# Altium schematic symbol library IC_ADI.SCHLIB: 3169 symbols (part 2 of 181)
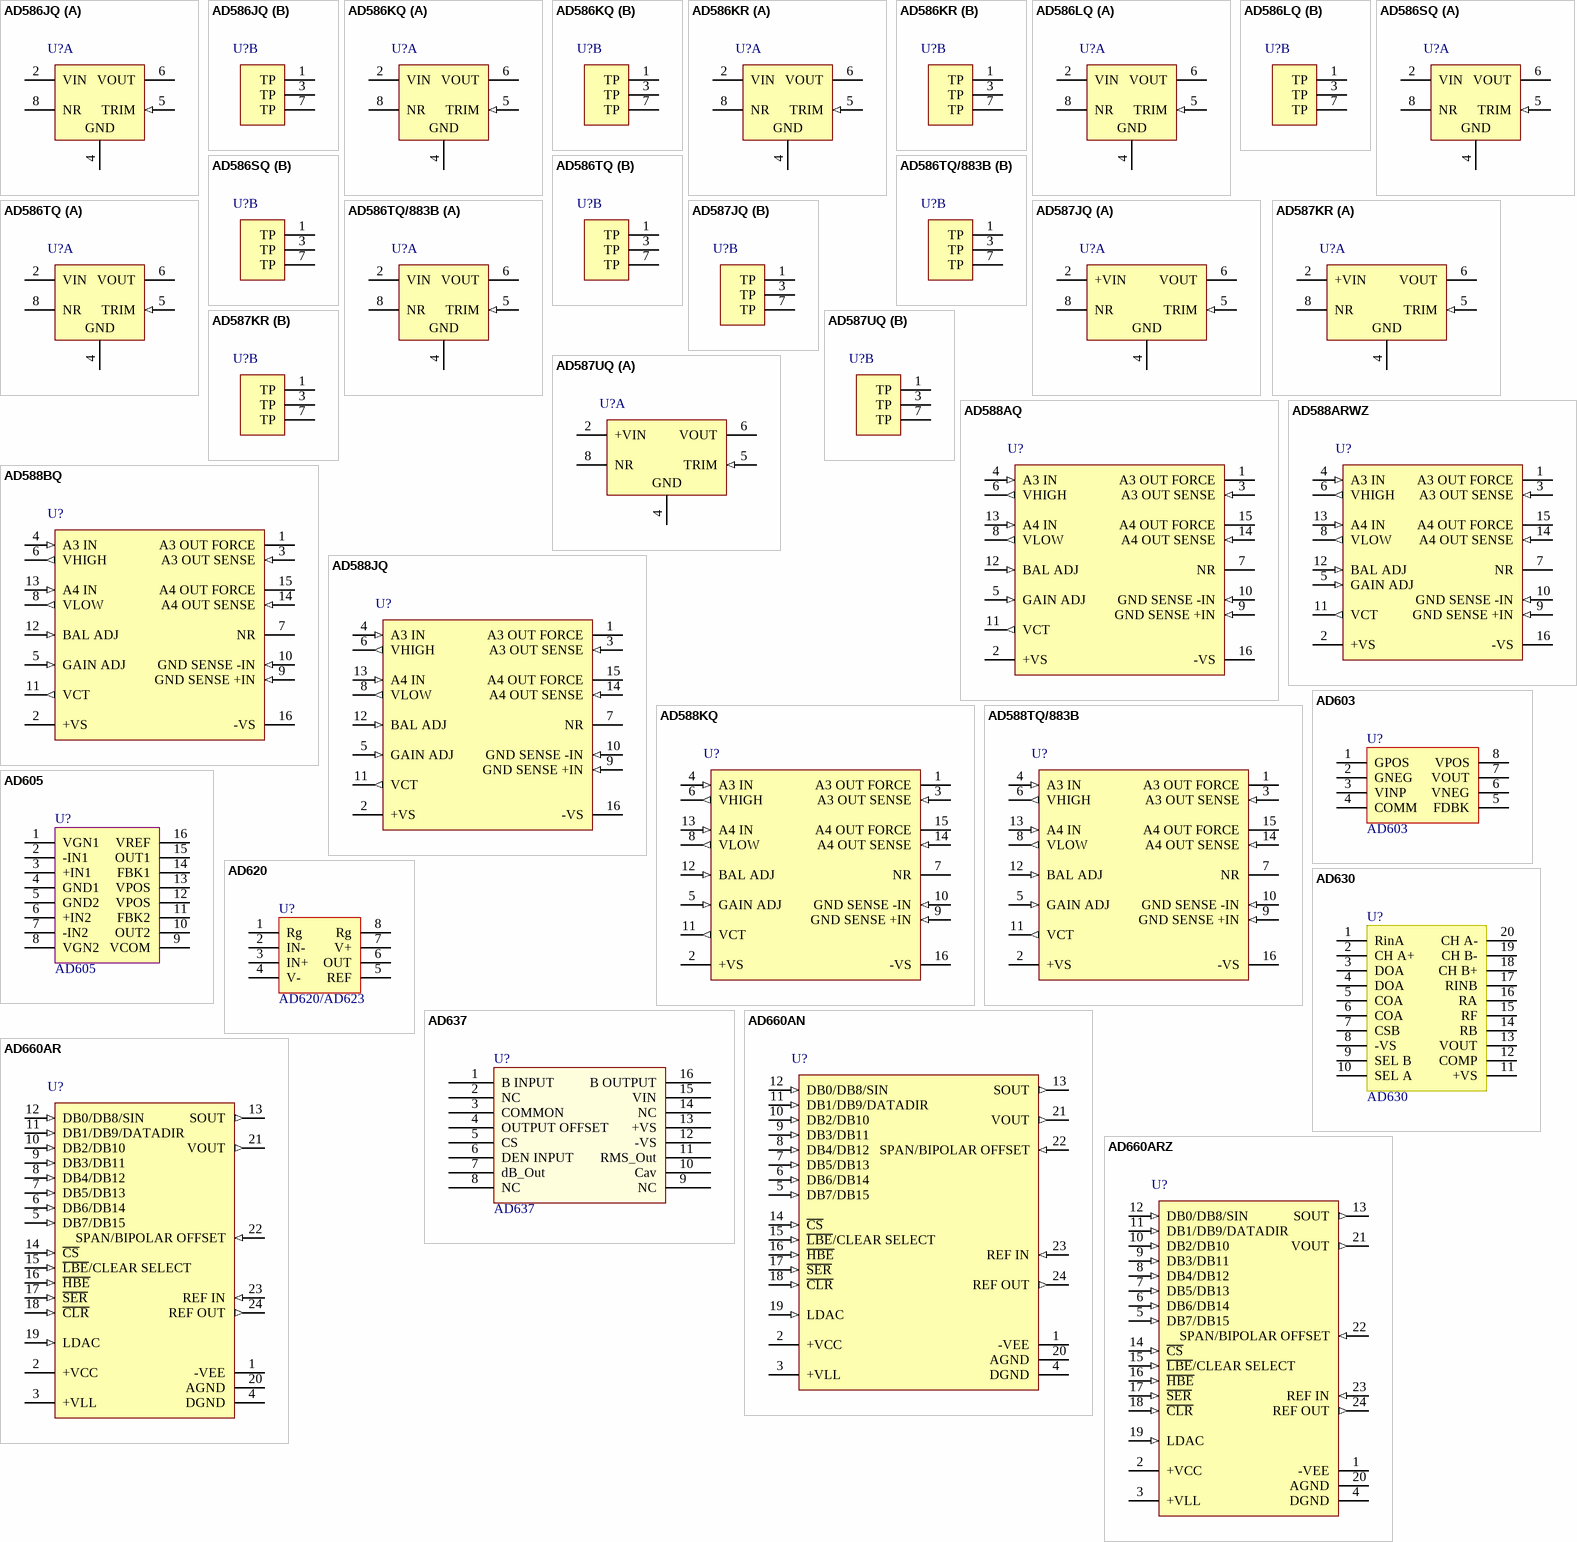
[diagram p192: symbols AD586JQ to AD660ARZ]

## AD587JQ
designator U?
High Precision Voltage Reference, 10 V Output, 13.5 to 36 V Supply, Commercial, 8-pin DIP (Q-8), Tube; PartNumber: AD587JQ; Ref Out TC (ppm/C): 20; Vout: 10V; DatasheetVersion: Rev. H; PackageVersion: Aug-05; PackageReference: Q-8; PackageDescription: 8-Pin Ceramic Dual In-Line Package, Row spacing 7.62 mm, Pitch 2.54 mm; Supplier Part Number 1: AD587JQ-ND; Supplier Part Number 2: 584-AD587JQ; Packing: Tube; Operating Temp Range: 0 to 70 degC; Mounting Technology: Through Hole; ComponentLink1Description: Manufacturer URL; ComponentLink2Description: Datasheet; ComponentLink3Description: Package Specification; ComponentLink4Description: URL Link1
footprint DIP8 (Footprint not found)
part A pins: 2 +VIN (power) "Input Voltage.", 4 GND (power) "Ground.", 5 TRIM (in) "Fine Trimming of Output Voltage.", 6 VOUT (power) "Output Voltage.", 8 NR "Noise Reduction of Output Voltage. Reduces noise via external capacitor to ground."
part B pins: 1 TP "No Connection. Leave floating.", 3 TP "No Connection. Leave floating.", 7 TP "No Connection. Leave floating."

## AD587KR
designator U?
High Precision Voltage Reference, 10 V Output, 13.5 to 36 V Supply, Commercial, 8-pin SOIC (R-8), Tube; PartNumber: AD587KR; Ref Out TC (ppm/C): 10; Vout: 10V; DatasheetVersion: Rev. H; PackageVersion: 060506-A, 06/2006; PackageReference: R-8; PackageDescription: 8-Pin Standard Small Outline Package, Body 4.9 x 3.9 mm, Pitch 1.27 mm; Supplier Part Number 1: AD587KR-ND; Supplier Part Number 2: N/A; Packing: Tube; Operating Temp Range: 0 to 70 degC; Mounting Technology: Surface Mount; Code_JEDEC: MS-012-AA; ComponentLink1Description: Manufacturer URL; ComponentLink2Description: Datasheet; ComponentLink3Description: Package Specification; ComponentLink4Description: URL Link1
footprint SOIC8_1.27 (Footprint not found)
part A pins: 2 +VIN (power) "Input Voltage.", 4 GND (power) "Ground.", 5 TRIM (in) "Fine Trimming of Output Voltage.", 6 VOUT (power) "Output Voltage.", 8 NR "Noise Reduction of Output Voltage. Reduces noise via external capacitor to ground."
part B pins: 1 TP "No Connection. Leave floating.", 3 TP "No Connection. Leave floating.", 7 TP "No Connection. Leave floating."

## AD587UQ
designator U?
High Precision Voltage Reference, 10 V Output, 13.5 to 36 V Supply, Military, 8-pin DIP (Q-8), Tube; PartNumber: AD587UQ; Ref Out TC (ppm/C): 5; Vout: 10V; DatasheetVersion: Rev. H; PackageVersion: Aug-05; PackageReference: Q-8; PackageDescription: 8-Pin Ceramic Dual In-Line Package, Row spacing 7.62 mm, Pitch 2.54 mm; Supplier Part Number 1: AD587UQ-ND; Supplier Part Number 2: 584-AD587UQ; Packing: Tube; Operating Temp Range: -55 to 125 degC; Mounting Technology: Through Hole; ComponentLink1Description: Manufacturer URL; ComponentLink2Description: Datasheet; ComponentLink3Description: Package Specification; ComponentLink4Description: URL Link1
footprint DIP8 (Footprint not found)
part A pins: 2 +VIN (power) "Input Voltage.", 4 GND (power) "Ground.", 5 TRIM (in) "Fine Trimming of Output Voltage.", 6 VOUT (power) "Output Voltage.", 8 NR "Noise Reduction of Output Voltage. Reduces noise via external capacitor to ground."
part B pins: 1 TP "No Connection. Leave floating.", 3 TP "No Connection. Leave floating.", 7 TP "No Connection. Leave floating."

## AD588AQ
designator U?
Multiple Output, High Precision, Dual-Tracking Reference, + / - 10, + / - 5 V Output, + / - 15 V Supply, Industrial, 16-pin DIP (Q-16), Tube; PartNumber: AD588AQ; Ref Out TC (ppm/C): 3; Vout: +/-5V, +/-10V; DatasheetVersion: Rev. L; PackageVersion: Aug-05; PackageReference: Q-16; PackageDescription: 16-Pin Ceramic Dual In-Line Package, Row spacing 7.62 mm, Pitch 2.54 mm; Supplier Part Number 1: AD588AQ-ND; Supplier Part Number 2: 584-AD588AQ; Packing: Tube; Operating Temp Range: -25 to 85 degC; Mounting Technology: Through Hole; ComponentLink1Description: Manufacturer URL; ComponentLink2Description: Datasheet; ComponentLink3Description: Package Specification; ComponentLink4Description: URL Link1
footprint DIP16 (Footprint not found)
pins: 1 A3 OUT FORCE (power) "Output from Buffering Amplifier 3 with Kelvin Force. Connect to Pin 3.", 2 +VS (power) "Positive Power Supply.", 3 A3 OUT SENSE (in) "Output from Buffering Amplifier 3 with Kelvin Sense. Connect to Pin 1.", 4 A3 IN (in) "+ Input to Amplifier 3. Connect to VHIGH, Pin 6.", 5 GAIN ADJ (in) "Reference Gain Adjustment for Calibration. See the Calibration section.", 6 VHIGH (out) "Unbuffered Reference High Output.", 7 NR "Noise Filtering Pin. Connect external 1 uF capacitor to ground to reduce the output noise (see the Noise Performance and Reduction section). Can be left open.", 8 VLOW (out) "Unbuffered Reference Low Output.", 9 GND SENSE +IN (in) "+ Input to the Ground Sense Amplifier.", 10 GND SENSE -IN (in) "- Input to the Ground Sense Amplifier.", 11 VCT (out) "Center Tap Voltage used for Calibration. See the Calibration section.", 12 BAL ADJ (in) "Reference Centering Adjustment for Calibration. See the Calibration section.", 13 A4 IN (in) "+ Input to Amplifier 4. Connect to VLOW, Pin 8.", 14 A4 OUT SENSE (in) "Output of Buffering Amplifier 4 with Kelvin Sense. Connect to Pin 15.", 15 A4 OUT FORCE (power) "Output of Buffering Amplifier 4 with Kelvin Force. Connect to Pin 14.", 16 -VS (power) "Negative Power Supply."

## AD588ARWZ
designator U?
Multiple Output, High Precision, Dual-Tracking Reference, + / - 10, + / - 5 V Output, + / - 15 V Supply, Industrial, 16-pin SOIC (RW-16), Tube; PartNumber: AD588ARWZ; Ref Out TC (ppm/C): 3; Vout: +/-5V, +/-10V; DatasheetVersion: Rev. L; PackageVersion: 032707-B, 03/2007; PackageReference: RW-16; PackageDescription: 16-Pin Standard Small Outline Package, Body 10.3 x 7.5 mm, Pitch 1.27 mm; Supplier Part Number 1: AD588ARWZ-ND; Supplier Part Number 2: 2377055; Supplier Part Number 3: 584-AD588ARWZ; Packing: Tube; Operating Temp Range: -25 to 85 degC; Mounting Technology: Surface Mount; Code_JEDEC: MS-013-AA; ComponentLink1Description: Manufacturer URL; ComponentLink2Description: Datasheet; ComponentLink3Description: Package Specification; ComponentLink4Description: URL Link1
footprint SOIC16W_1.27 (Footprint not found)
pins: 1 A3 OUT FORCE (power) "Output from Buffering Amplifier 3 with Kelvin Force. Connect to Pin 3.", 2 +VS (power) "Positive Power Supply.", 3 A3 OUT SENSE (in) "Output from Buffering Amplifier 3 with Kelvin Sense. Connect to Pin 1.", 4 A3 IN (in) "+ Input to Amplifier 3. Connect to VHIGH, Pin 6.", 5 GAIN ADJ (in) "Reference Gain Adjustment for Calibration. See the Calibration section.", 6 VHIGH (out) "Unbuffered Reference High Output.", 7 NR "Noise Filtering Pin. Connect external 1 uF capacitor to ground to reduce the output noise (see the Noise Performance and Reduction section). Can be left open.", 8 VLOW (out) "Unbuffered Reference Low Output.", 9 GND SENSE +IN (in) "+ Input to the Ground Sense Amplifier.", 10 GND SENSE -IN (in) "- Input to the Ground Sense Amplifier.", 11 VCT (out) "Center Tap Voltage used for Calibration. See the Calibration section.", 12 BAL ADJ (in) "Reference Centering Adjustment for Calibration. See the Calibration section.", 13 A4 IN (in) "+ Input to Amplifier 4. Connect to VLOW, Pin 8.", 14 A4 OUT SENSE (in) "Output of Buffering Amplifier 4 with Kelvin Sense. Connect to Pin 15.", 15 A4 OUT FORCE (power) "Output of Buffering Amplifier 4 with Kelvin Force. Connect to Pin 14.", 16 -VS (power) "Negative Power Supply."

## AD588BQ
designator U?
Multiple Output, High Precision, Dual-Tracking Reference, + / - 10, + / - 5 V Output, + / - 15 V Supply, Industrial, 16-pin DIP (Q-16), Tube; PartNumber: AD588BQ; Ref Out TC (ppm/C): 1.5; Vout: +/-5V, +/-10V; DatasheetVersion: Rev. L; PackageVersion: Aug-05; PackageReference: Q-16; PackageDescription: 16-Pin Ceramic Dual In-Line Package, Row spacing 7.62 mm, Pitch 2.54 mm; Supplier Part Number 1: AD588BQ-ND; Supplier Part Number 2: 584-AD588BQ; Packing: Tube; Operating Temp Range: -25 to 85 degC; Mounting Technology: Through Hole; ComponentLink1Description: Manufacturer URL; ComponentLink2Description: Datasheet; ComponentLink3Description: Package Specification; ComponentLink4Description: URL Link1
footprint DIP16 (Footprint not found)
pins: 1 A3 OUT FORCE (power) "Output from Buffering Amplifier 3 with Kelvin Force. Connect to Pin 3.", 2 +VS (power) "Positive Power Supply.", 3 A3 OUT SENSE (in) "Output from Buffering Amplifier 3 with Kelvin Sense. Connect to Pin 1.", 4 A3 IN (in) "+ Input to Amplifier 3. Connect to VHIGH, Pin 6.", 5 GAIN ADJ (in) "Reference Gain Adjustment for Calibration. See the Calibration section.", 6 VHIGH (out) "Unbuffered Reference High Output.", 7 NR "Noise Filtering Pin. Connect external 1 uF capacitor to ground to reduce the output noise (see the Noise Performance and Reduction section). Can be left open.", 8 VLOW (out) "Unbuffered Reference Low Output.", 9 GND SENSE +IN (in) "+ Input to the Ground Sense Amplifier.", 10 GND SENSE -IN (in) "- Input to the Ground Sense Amplifier.", 11 VCT (out) "Center Tap Voltage used for Calibration. See the Calibration section.", 12 BAL ADJ (in) "Reference Centering Adjustment for Calibration. See the Calibration section.", 13 A4 IN (in) "+ Input to Amplifier 4. Connect to VLOW, Pin 8.", 14 A4 OUT SENSE (in) "Output of Buffering Amplifier 4 with Kelvin Sense. Connect to Pin 15.", 15 A4 OUT FORCE (power) "Output of Buffering Amplifier 4 with Kelvin Force. Connect to Pin 14.", 16 -VS (power) "Negative Power Supply."

## AD588JQ
designator U?
Multiple Output, High Precision, Dual-Tracking Reference, + / - 10, + / - 5 V Output, + / - 15 V Supply, Commercial, 16-pin DIP (Q-16), Tube; PartNumber: AD588JQ; Ref Out TC (ppm/C): 3; Vout: +/-5V, +/-10V; DatasheetVersion: Rev. L; PackageVersion: Aug-05; PackageReference: Q-16; PackageDescription: 16-Pin Ceramic Dual In-Line Package, Row spacing 7.62 mm, Pitch 2.54 mm; Supplier Part Number 1: AD588JQ-ND; Supplier Part Number 2: 411700; Supplier Part Number 3: 584-AD588JQ; Packing: Tube; Operating Temp Range: 0 to 70 degC; Mounting Technology: Through Hole; ComponentLink1Description: Manufacturer URL; ComponentLink2Description: Datasheet; ComponentLink3Description: Package Specification; ComponentLink4Description: URL Link1
footprint DIP16 (Footprint not found)
pins: 1 A3 OUT FORCE (power) "Output from Buffering Amplifier 3 with Kelvin Force. Connect to Pin 3.", 2 +VS (power) "Positive Power Supply.", 3 A3 OUT SENSE (in) "Output from Buffering Amplifier 3 with Kelvin Sense. Connect to Pin 1.", 4 A3 IN (in) "+ Input to Amplifier 3. Connect to VHIGH, Pin 6.", 5 GAIN ADJ (in) "Reference Gain Adjustment for Calibration. See the Calibration section.", 6 VHIGH (out) "Unbuffered Reference High Output.", 7 NR "Noise Filtering Pin. Connect external 1 uF capacitor to ground to reduce the output noise (see the Noise Performance and Reduction section). Can be left open.", 8 VLOW (out) "Unbuffered Reference Low Output.", 9 GND SENSE +IN (in) "+ Input to the Ground Sense Amplifier.", 10 GND SENSE -IN (in) "- Input to the Ground Sense Amplifier.", 11 VCT (out) "Center Tap Voltage used for Calibration. See the Calibration section.", 12 BAL ADJ (in) "Reference Centering Adjustment for Calibration. See the Calibration section.", 13 A4 IN (in) "+ Input to Amplifier 4. Connect to VLOW, Pin 8.", 14 A4 OUT SENSE (in) "Output of Buffering Amplifier 4 with Kelvin Sense. Connect to Pin 15.", 15 A4 OUT FORCE (power) "Output of Buffering Amplifier 4 with Kelvin Force. Connect to Pin 14.", 16 -VS (power) "Negative Power Supply."

## AD588KQ
designator U?
Multiple Output, High Precision, Dual-Tracking Reference, + / - 10, + / - 5 V Output, + / - 15 V Supply, Commercial, 16-pin DIP (Q-16), Tube; PartNumber: AD588KQ; Ref Out TC (ppm/C): 1.5; Vout: +/-5V, +/-10V; DatasheetVersion: Rev. L; PackageVersion: Aug-05; PackageReference: Q-16; PackageDescription: 16-Pin Ceramic Dual In-Line Package, Row spacing 7.62 mm, Pitch 2.54 mm; Supplier Part Number 1: AD588KQ-ND; Supplier Part Number 2: 584-AD588KQ; Packing: Tube; Operating Temp Range: 0 to 70 degC; Mounting Technology: Through Hole; ComponentLink1Description: Manufacturer URL; ComponentLink2Description: Datasheet; ComponentLink3Description: Package Specification; ComponentLink4Description: URL Link1
footprint DIP16 (Footprint not found)
pins: 1 A3 OUT FORCE (power) "Output from Buffering Amplifier 3 with Kelvin Force. Connect to Pin 3.", 2 +VS (power) "Positive Power Supply.", 3 A3 OUT SENSE (in) "Output from Buffering Amplifier 3 with Kelvin Sense. Connect to Pin 1.", 4 A3 IN (in) "+ Input to Amplifier 3. Connect to VHIGH, Pin 6.", 5 GAIN ADJ (in) "Reference Gain Adjustment for Calibration. See the Calibration section.", 6 VHIGH (out) "Unbuffered Reference High Output.", 7 NR "Noise Filtering Pin. Connect external 1 uF capacitor to ground to reduce the output noise (see the Noise Performance and Reduction section). Can be left open.", 8 VLOW (out) "Unbuffered Reference Low Output.", 9 GND SENSE +IN (in) "+ Input to the Ground Sense Amplifier.", 10 GND SENSE -IN (in) "- Input to the Ground Sense Amplifier.", 11 VCT (out) "Center Tap Voltage used for Calibration. See the Calibration section.", 12 BAL ADJ (in) "Reference Centering Adjustment for Calibration. See the Calibration section.", 13 A4 IN (in) "+ Input to Amplifier 4. Connect to VLOW, Pin 8.", 14 A4 OUT SENSE (in) "Output of Buffering Amplifier 4 with Kelvin Sense. Connect to Pin 15.", 15 A4 OUT FORCE (power) "Output of Buffering Amplifier 4 with Kelvin Force. Connect to Pin 14.", 16 -VS (power) "Negative Power Supply."

## AD588TQ/883B
designator U?
Multiple Output, High Precision, Dual-Tracking Reference, + / - 10, + / - 5 V Output, + / - 15 V Supply, Military, 16-pin DIP (Q-16), Tube; PartNumber: AD588TQ/883B; Vout: +/-5V, +/-10V; DatasheetVersion: Rev. L; PackageVersion: Aug-05; PackageReference: Q-16; PackageDescription: 16-Pin Ceramic Dual In-Line Package, Row spacing 7.62 mm, Pitch 2.54 mm; Supplier Part Number 1: 584-AD588TQ883B; Packing: Tube; Mounting Technology: Through Hole; ComponentLink1Description: Manufacturer URL; ComponentLink2Description: Datasheet; ComponentLink3Description: Package Specification; ComponentLink4Description: URL Link1
footprint DIP16 (Footprint not found)
pins: 1 A3 OUT FORCE (power) "Output from Buffering Amplifier 3 with Kelvin Force. Connect to Pin 3.", 2 +VS (power) "Positive Power Supply.", 3 A3 OUT SENSE (in) "Output from Buffering Amplifier 3 with Kelvin Sense. Connect to Pin 1.", 4 A3 IN (in) "+ Input to Amplifier 3. Connect to VHIGH, Pin 6.", 5 GAIN ADJ (in) "Reference Gain Adjustment for Calibration. See the Calibration section.", 6 VHIGH (out) "Unbuffered Reference High Output.", 7 NR "Noise Filtering Pin. Connect external 1 uF capacitor to ground to reduce the output noise (see the Noise Performance and Reduction section). Can be left open.", 8 VLOW (out) "Unbuffered Reference Low Output.", 9 GND SENSE +IN (in) "+ Input to the Ground Sense Amplifier.", 10 GND SENSE -IN (in) "- Input to the Ground Sense Amplifier.", 11 VCT (out) "Center Tap Voltage used for Calibration. See the Calibration section.", 12 BAL ADJ (in) "Reference Centering Adjustment for Calibration. See the Calibration section.", 13 A4 IN (in) "+ Input to Amplifier 4. Connect to VLOW, Pin 8.", 14 A4 OUT SENSE (in) "Output of Buffering Amplifier 4 with Kelvin Sense. Connect to Pin 15.", 15 A4 OUT FORCE (power) "Output of Buffering Amplifier 4 with Kelvin Force. Connect to Pin 14.", 16 -VS (power) "Negative Power Supply."

## AD603
designator U?
footprint SOIC8_1.27 (SOP, 8-Leads, Pitch 1.27mm)
pins: 1 GPOS, 2 GNEG, 3 VINP, 4 COMM, 5 FDBK, 6 VNEG, 7 VOUT, 8 VPOS

## AD605
designator U?
footprint SOIC16_1.27
pins: 1 VGN1, 2 -IN1, 3 +IN1, 4 GND1, 5 GND2, 6 +IN2, 7 -IN2, 8 VGN2, 9 VCOM, 10 OUT2, 11 FBK2, 12 VPOS, 13 VPOS, 14 FBK1, 15 OUT1, 16 VREF

## AD620
designator U?, comment AD620/AD623
footprint SOIC8_1.27 (SOP, 8-Leads, Pitch 1.27mm)
pins: 1 Rg, 2 IN-, 3 IN+, 4 V-, 5 REF, 6 OUT, 7 V+, 8 Rg

## AD630
designator U?
footprint SOIC20W_1.27
pins: 1 RinA, 2 CH A+, 3 DOA, 4 DOA, 5 COA, 6 COA, 7 CSB, 8 -VS, 9 SEL B, 10 SEL A, 11 +VS, 12 COMP, 13 VOUT, 14 RB, 15 RF, 16 RA, 17 RINB, 18 CH B+, 19 CH B-, 20 CH A-

## AD637
designator U?
footprint SOIC16W_1.27
pins: 1 B INPUT, 2 NC, 3 COMMON, 4 OUTPUT OFFSET, 5 CS, 6 DEN INPUT, 7 dB_Out, 8 NC, 9 NC, 10 Cav, 11 RMS_Out, 12 -VS, 13 +VS, 14 NC, 15 VIN, 16 B OUTPUT

## AD660AN
designator U?
Single 16-Bit Monolithic DACPORT, -40 to +85 degC, N-24-1, Tube; Generic Part Number: AD660; PartNumber: AD660AN; # DAC Outputs: 1; Max V+: 16.5V; Op Pwr Diss: 625mW; Resolution (Bits): 16; Settling Time: 6祍; Single Supply: No; DatasheetVersion: Rev.B; PackageVersion: 071006-A; PackageReference: N-24-1; PackageDescription: 24-Lead Plastic Dual In-Line Package [PDIP] Narrow Body; Supplier Part Number 1: AD660AN-ND; Supplier Part Number 2: 66F5806; Supplier Part Number 3: 584-AD660AN; Packing: Tube; RoHS: N; Mounting Technology: Through Hole; Code_JEDEC: MS-001; ComponentLink1Description: Manufacturer URL; ComponentLink2Description: Datasheet; ComponentLink3Description: Package Specification; ComponentLink4Description: Product URL
footprint DIP24 (Footprint not found)
pins: 1 -VEE (power) "Negative Analog Supply Pin", 2 +VCC (power) "Positive Analog Supply Pin", 3 +VLL (power) "Digital Supply Pin", 4 DGND (power) "Digital Ground Reference Pin", 5 DB7/DB15 (in) "DB7 and DB15 Byte Load Data Input Pin", 6 DB6/DB14 (in) "DB6 and DB14 Byte Load Data Input Pin", 7 DB5/DB13 (in) "DB5 and DB13 Byte Load Data Input Pin", 8 DB4/DB12 (in) "DB4 and DB12 Byte Load Data Input Pin", 9 DB3/DB11 (in) "DB3 and DB11 Byte Load Data Input Pin", 10 DB2/DB10 (in) "DB2 and DB10 Byte Load Data Input Pin", 11 DB1/DB9/DATADIR (in) "DB1 and DB9 Byte Load Data Input Pin/MSB or L\S\B\ First Data Direction Serial Input Select Pin", 12 DB0/DB8/SIN (in) "DB0 and DB8 Byte Load Data Input Pin/Serial Data Input Pin", 13 SOUT (out) "Serial Data Output Pin", 14 ~{CS} (in) "Chip Select Pin", 15 ~{LBE}/CLEAR SELECT (in) "Low Byte Enable Pin/U\n\i\p\o\l\ar or Bipolar Clear Select Pin", 16 ~{HBE} (in) "High Byte Enable Pin", 17 ~{SER} (in) "Serial Input Enable Pin", 18 ~{CLR} (in) "Output Clear Pin", 19 LDAC (in) "Load DAC Pin", 20 AGND (power) "Analog Ground Reference Pin", 21 VOUT (out) "Voltage Output Pin", 22 SPAN/BIPOLAR OFFSET (in) "Output Span Configuration Pin", 23 REF IN (in) "External Reference Voltage Input Pin", 24 REF OUT (out) "Internal Reference Voltage Output Pin"

## AD660AR
designator U?
Single 16-Bit Monolithic DACPORT, -40 to +85 degC, RW-24, Tube; Generic Part Number: AD660; PartNumber: AD660AR; # DAC Outputs: 1; Max V+: 16.5V; Op Pwr Diss: 625mW; Resolution (Bits): 16; Settling Time: 6祍; Single Supply: No; DatasheetVersion: Rev.B; PackageVersion: 060706-A; PackageReference: RW-24; PackageDescription: 24-Lead Standard Small Outline Package [SOIC_W]; Supplier Part Number 1: AD660AR-ND; Supplier Part Number 2: 584-AD660AR; Packing: Tube; RoHS: N; Mounting Technology: Surface Mount; Code_JEDEC: MS-013-AD; ComponentLink1Description: Manufacturer URL; ComponentLink2Description: Datasheet; ComponentLink3Description: Package Specification; ComponentLink4Description: Product URL
footprint SOIC24W_1.27 (Footprint not found)
pins: 1 -VEE (power) "Negative Analog Supply Pin", 2 +VCC (power) "Positive Analog Supply Pin", 3 +VLL (power) "Digital Supply Pin", 4 DGND (power) "Digital Ground Reference Pin", 5 DB7/DB15 (in) "DB7 and DB15 Byte Load Data Input Pin", 6 DB6/DB14 (in) "DB6 and DB14 Byte Load Data Input Pin", 7 DB5/DB13 (in) "DB5 and DB13 Byte Load Data Input Pin", 8 DB4/DB12 (in) "DB4 and DB12 Byte Load Data Input Pin", 9 DB3/DB11 (in) "DB3 and DB11 Byte Load Data Input Pin", 10 DB2/DB10 (in) "DB2 and DB10 Byte Load Data Input Pin", 11 DB1/DB9/DATADIR (in) "DB1 and DB9 Byte Load Data Input Pin/MSB or L\S\B\ First Data Direction Serial Input Select Pin", 12 DB0/DB8/SIN (in) "DB0 and DB8 Byte Load Data Input Pin/Serial Data Input Pin", 13 SOUT (out) "Serial Data Output Pin", 14 ~{CS} (in) "Chip Select Pin", 15 ~{LBE}/CLEAR SELECT (in) "Low Byte Enable Pin/U\n\i\p\o\l\a\r\ or Bipolar Clear Select Pin", 16 ~{HBE} (in) "High Byte Enable Pin", 17 ~{SER} (in) "Serial Input Enable Pin", 18 ~{CLR} (in) "Output Clear Pin", 19 LDAC (in) "Load DAC Pin", 20 AGND (power) "Analog Ground Reference Pin", 21 VOUT (out) "Voltage Output Pin", 22 SPAN/BIPOLAR OFFSET (in) "Output Span Configuration Pin", 23 REF IN (in) "External Reference Voltage Input Pin", 24 REF OUT (out) "Internal Reference Voltage Output Pin"

## AD660ARZ
designator U?
Single 16-Bit Monolithic DACPORT, -40 to +85 degC, RW-24, Pb-Free, Tube; Generic Part Number: AD660; PartNumber: AD660ARZ; # DAC Outputs: 1; Max V+: 16.5V; Op Pwr Diss: 625mW; Resolution (Bits): 16; Settling Time: 6祍; Single Supply: No; DatasheetVersion: Rev.B; PackageVersion: 060706-A; PackageReference: RW-24; PackageDescription: 24-Lead Standard Small Outline Package [SOIC_W]; Supplier Part Number 1: AD660ARZ-ND; Supplier Part Number 2: 12M8704; Supplier Part Number 3: 584-AD660ARZ; Packing: Tube; RoHS: Y; Mounting Technology: Surface Mount; Code_JEDEC: MS-013-AD; ComponentLink1Description: Manufacturer URL; ComponentLink2Description: Datasheet; ComponentLink3Description: Package Specification; ComponentLink4Description: Product URL
footprint SOIC24W_1.27 (Footprint not found)
pins: 1 -VEE (power) "Negative Analog Supply Pin", 2 +VCC (power) "Positive Analog Supply Pin", 3 +VLL (power) "Digital Supply Pin", 4 DGND (power) "Digital Ground Reference Pin", 5 DB7/DB15 (in) "DB7 and DB15 Byte Load Data Input Pin", 6 DB6/DB14 (in) "DB6 and DB14 Byte Load Data Input Pin", 7 DB5/DB13 (in) "DB5 and DB13 Byte Load Data Input Pin", 8 DB4/DB12 (in) "DB4 and DB12 Byte Load Data Input Pin", 9 DB3/DB11 (in) "DB3 and DB11 Byte Load Data Input Pin", 10 DB2/DB10 (in) "DB2 and DB10 Byte Load Data Input Pin", 11 DB1/DB9/DATADIR (in) "DB1 and DB9 Byte Load Data Input Pin/MSB or L\S\B\ First Data Direction Serial Input Select Pin", 12 DB0/DB8/SIN (in) "DB0 and DB8 Byte Load Data Input Pin/Serial Data Input Pin", 13 SOUT (out) "Serial Data Output Pin", 14 ~{CS} (in) "Chip Select Pin", 15 ~{LBE}/CLEAR SELECT (in) "Low Byte Enable Pin/U\n\i\p\o\l\a\r\ or Bipolar Clear Select Pin", 16 ~{HBE} (in) "High Byte Enable Pin", 17 ~{SER} (in) "Serial Input Enable Pin", 18 ~{CLR} (in) "Output Clear Pin", 19 LDAC (in) "Load DAC Pin", 20 AGND (power) "Analog Ground Reference Pin", 21 VOUT (out) "Voltage Output Pin", 22 SPAN/BIPOLAR OFFSET (in) "Output Span Configuration Pin", 23 REF IN (in) "External Reference Voltage Input Pin", 24 REF OUT (out) "Internal Reference Voltage Output Pin"

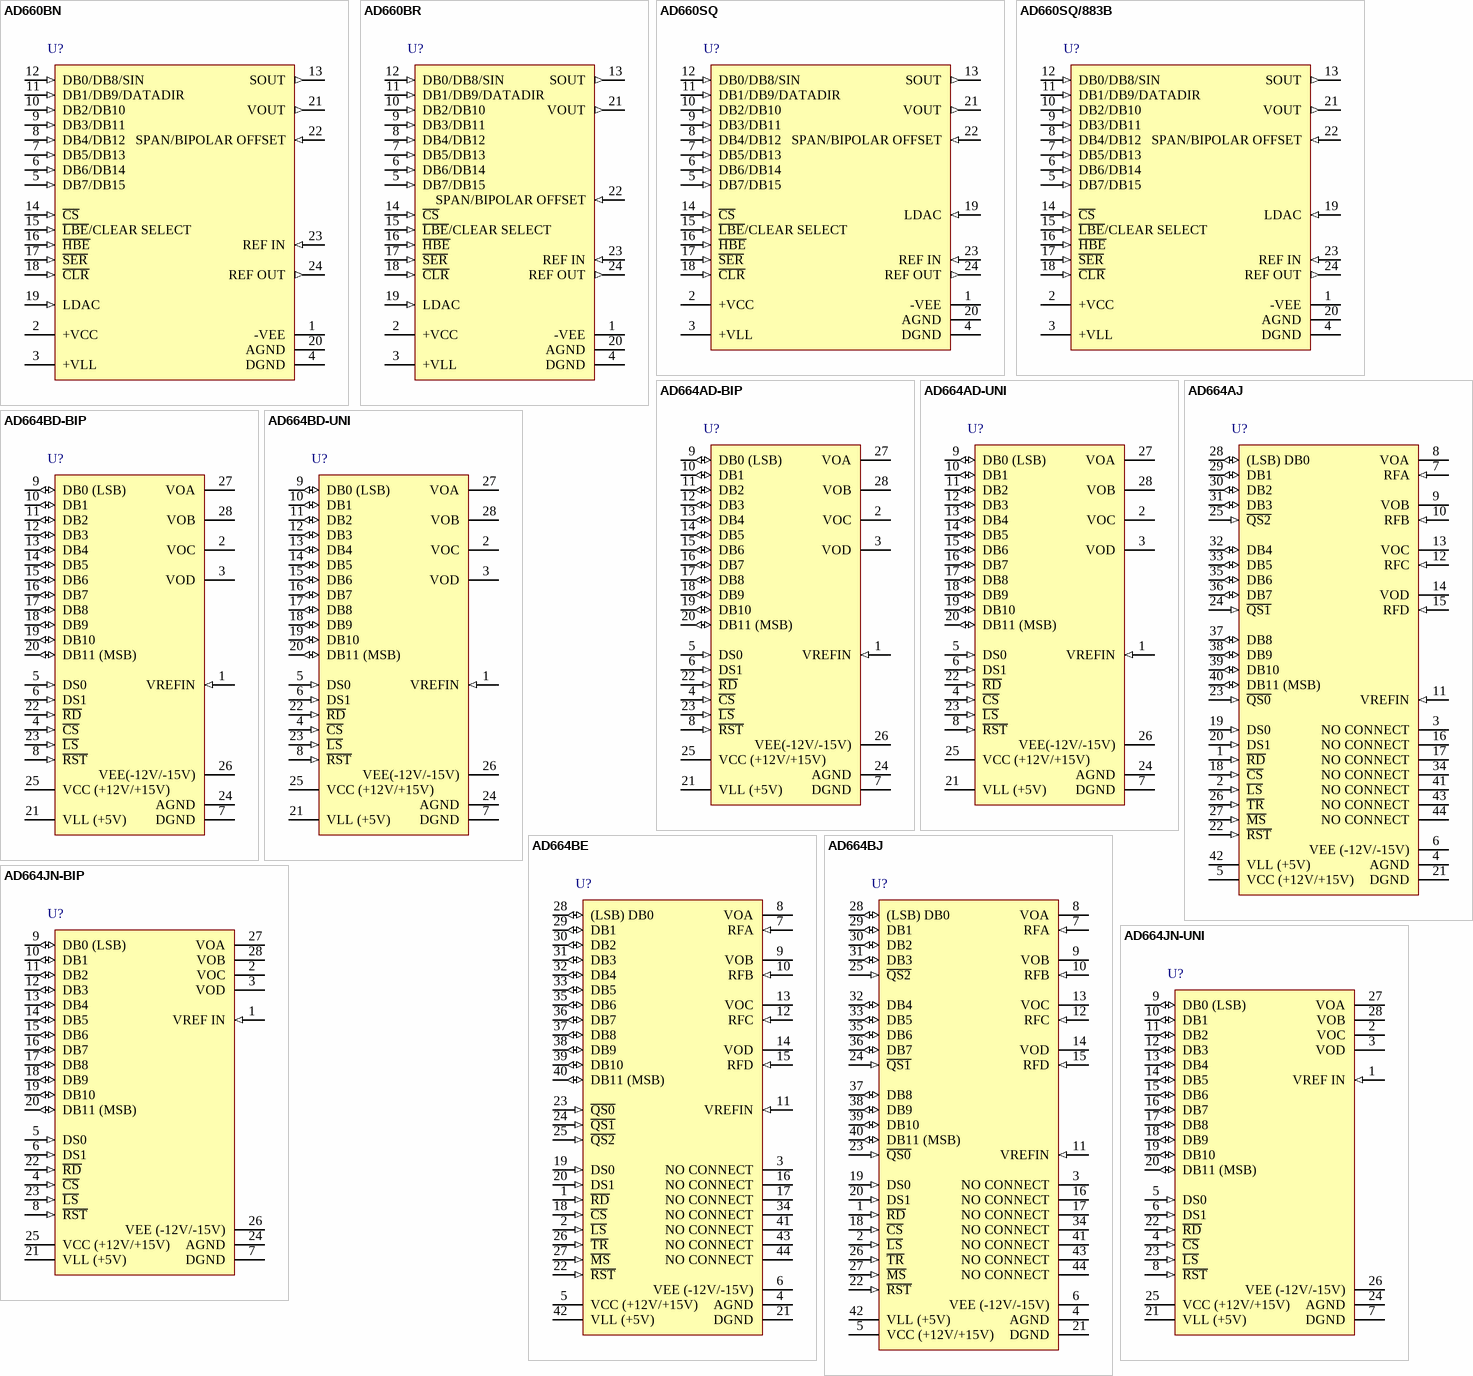
[diagram p2: symbols AD660BN to AD664JN-UNI]

## AD660BN
designator U?
Single 16-Bit Monolithic DACPORT, -40 to +85 degC, N-24-1, Tube; Generic Part Number: AD660; PartNumber: AD660BN; # DAC Outputs: 1; Max V+: 16.5V; Op Pwr Diss: 625mW; Resolution (Bits): 16; Settling Time: 6祍; Single Supply: No; DatasheetVersion: Rev.B; PackageVersion: 071006-A; PackageReference: N-24-1; PackageDescription: 24-Lead Plastic Dual In-Line Package [PDIP] Narrow Body; Supplier Part Number 1: AD660BN-ND; Supplier Part Number 2: 66F5808; Supplier Part Number 3: 584-AD660BN; Packing: Tube; RoHS: N; Mounting Technology: Through Hole; Code_JEDEC: MS-001; ComponentLink1Description: Manufacturer URL; ComponentLink2Description: Datasheet; ComponentLink3Description: Package Specification; ComponentLink4Description: Product URL
footprint DIP24 (Footprint not found)
pins: 1 -VEE (power) "Negative Analog Supply Pin", 2 +VCC (power) "Positive Analog Supply Pin", 3 +VLL (power) "Digital Supply Pin", 4 DGND (power) "Digital Ground Reference Pin", 5 DB7/DB15 (in) "DB7 and DB15 Byte Load Data Input Pin", 6 DB6/DB14 (in) "DB6 and DB14 Byte Load Data Input Pin", 7 DB5/DB13 (in) "DB5 and DB13 Byte Load Data Input Pin", 8 DB4/DB12 (in) "DB4 and DB12 Byte Load Data Input Pin", 9 DB3/DB11 (in) "DB3 and DB11 Byte Load Data Input Pin", 10 DB2/DB10 (in) "DB2 and DB10 Byte Load Data Input Pin", 11 DB1/DB9/DATADIR (in) "DB1 and DB9 Byte Load Data Input Pin/MSB or L\S\B\ First Data Direction Serial Input Select Pin", 12 DB0/DB8/SIN (in) "DB0 and DB8 Byte Load Data Input Pin/Serial Data Input Pin", 13 SOUT (out) "Serial Data Output Pin", 14 ~{CS} (in) "Chip Select Pin", 15 ~{LBE}/CLEAR SELECT (in) "Low Byte Enable Pin/U\n\i\p\o\l\ar or Bipolar Clear Select Pin", 16 ~{HBE} (in) "High Byte Enable Pin", 17 ~{SER} (in) "Serial Input Enable Pin", 18 ~{CLR} (in) "Output Clear Pin", 19 LDAC (in) "Load DAC Pin", 20 AGND (power) "Analog Ground Reference Pin", 21 VOUT (out) "Voltage Output Pin", 22 SPAN/BIPOLAR OFFSET (in) "Output Span Configuration Pin", 23 REF IN (in) "External Reference Voltage Input Pin", 24 REF OUT (out) "Internal Reference Voltage Output Pin"

## AD660BR
designator U?
Single 16-Bit Monolithic DACPORT, -40 to +85 degC, RW-24, Tube; Generic Part Number: AD660; PartNumber: AD660BR; # DAC Outputs: 1; Max V+: 16.5V; Op Pwr Diss: 625mW; Resolution (Bits): 16; Settling Time: 6祍; Single Supply: No; DatasheetVersion: Rev.B; PackageVersion: 060706-A; PackageReference: RW-24; PackageDescription: 24-Lead Standard Small Outline Package [SOIC_W]; Supplier Part Number 1: AD660BR-ND; Supplier Part Number 2: 09B5458; Supplier Part Number 3: 584-AD660BR; Packing: Tube; RoHS: N; Mounting Technology: Surface Mount; Code_JEDEC: MS-013-AD; ComponentLink1Description: Manufacturer URL; ComponentLink2Description: Datasheet; ComponentLink3Description: Package Specification; ComponentLink4Description: Product URL
footprint SOIC24W_1.27 (Footprint not found)
pins: 1 -VEE (power) "Negative Analog Supply Pin", 2 +VCC (power) "Positive Analog Supply Pin", 3 +VLL (power) "Digital Supply Pin", 4 DGND (power) "Digital Ground Reference Pin", 5 DB7/DB15 (in) "DB7 and DB15 Byte Load Data Input Pin", 6 DB6/DB14 (in) "DB6 and DB14 Byte Load Data Input Pin", 7 DB5/DB13 (in) "DB5 and DB13 Byte Load Data Input Pin", 8 DB4/DB12 (in) "DB4 and DB12 Byte Load Data Input Pin", 9 DB3/DB11 (in) "DB3 and DB11 Byte Load Data Input Pin", 10 DB2/DB10 (in) "DB2 and DB10 Byte Load Data Input Pin", 11 DB1/DB9/DATADIR (in) "DB1 and DB9 Byte Load Data Input Pin/MSB or L\S\B\ First Data Direction Serial Input Select Pin", 12 DB0/DB8/SIN (in) "DB0 and DB8 Byte Load Data Input Pin/Serial Data Input Pin", 13 SOUT (out) "Serial Data Output Pin", 14 ~{CS} (in) "Chip Select Pin", 15 ~{LBE}/CLEAR SELECT (in) "Low Byte Enable Pin/U\n\i\p\o\l\a\r\ or Bipolar Clear Select Pin", 16 ~{HBE} (in) "High Byte Enable Pin", 17 ~{SER} (in) "Serial Input Enable Pin", 18 ~{CLR} (in) "Output Clear Pin", 19 LDAC (in) "Load DAC Pin", 20 AGND (power) "Analog Ground Reference Pin", 21 VOUT (out) "Voltage Output Pin", 22 SPAN/BIPOLAR OFFSET (in) "Output Span Configuration Pin", 23 REF IN (in) "External Reference Voltage Input Pin", 24 REF OUT (out) "Internal Reference Voltage Output Pin"

## AD660SQ
designator U?
Single 16-Bit Monolithic DACPORT, -55 to +125 degC, Q-24-1, Tube; Generic Part Number: AD660; PartNumber: AD660SQ; # DAC Outputs: 1; Max V+: 16.5V; Op Pwr Diss: 625mW; Resolution (Bits): 16; Settling Time: 6祍; Single Supply: No; DatasheetVersion: Rev.B; PackageVersion: 100808-A; PackageReference: Q-24-1; PackageDescription: 24-Lead Ceramic Dual In-Line Package [CERDIP]; Supplier Part Number 1: AD660SQ-ND; Supplier Part Number 2: 584-AD660SQ; Packing: Tube; RoHS: N; Mounting Technology: Through Hole; ComponentLink1Description: Manufacturer URL; ComponentLink2Description: Datasheet; ComponentLink3Description: Package Specification; ComponentLink4Description: Product URL
footprint DIP24 (Footprint not found)
pins: 1 -VEE (power) "Negative Analog Supply Pin", 2 +VCC (power) "Positive Analog Supply Pin", 3 +VLL (power) "Digital Supply Pin", 4 DGND (power) "Digital Ground Reference Pin", 5 DB7/DB15 (in) "DB7 and DB15 Byte Load Data Input Pin", 6 DB6/DB14 (in) "DB6 and DB14 Byte Load Data Input Pin", 7 DB5/DB13 (in) "DB5 and DB13 Byte Load Data Input Pin", 8 DB4/DB12 (in) "DB4 and DB12 Byte Load Data Input Pin", 9 DB3/DB11 (in) "DB3 and DB11 Byte Load Data Input Pin", 10 DB2/DB10 (in) "DB2 and DB10 Byte Load Data Input Pin", 11 DB1/DB9/DATADIR (in) "DB1 and DB9 Byte Load Data Input Pin/MSB or L\S\B\ First Data Direction Serial Input Select Pin", 12 DB0/DB8/SIN (in) "DB0 and DB8 Byte Load Data Input Pin/Serial Data Input Pin", 13 SOUT (out) "Serial Data Output Pin", 14 ~{CS} (in) "Chip Select Pin", 15 ~{LBE}/CLEAR SELECT (in) "Low Byte Enable Pin/U\n\i\p\o\l\ar or Bipolar Clear Select Pin", 16 ~{HBE} (in) "High Byte Enable Pin", 17 ~{SER} (in) "Serial Input Enable Pin", 18 ~{CLR} (in) "Output Clear Pin", 19 LDAC (in) "Load DAC Pin", 20 AGND (power) "Analog Ground Reference Pin", 21 VOUT (out) "Voltage Output Pin", 22 SPAN/BIPOLAR OFFSET (in) "Output Span Configuration Pin", 23 REF IN (in) "External Reference Voltage Input Pin", 24 REF OUT (out) "Internal Reference Voltage Output Pin"

## AD660SQ/883B
designator U?
Single 16-Bit Monolithic DACPORT, -55 to +125 degC, Q-24-1, Tube; Generic Part Number: AD660; PartNumber: AD660SQ/883B; # DAC Outputs: 1; Max V+: 16.5V; Op Pwr Diss: 625mW; Resolution (Bits): 16; Settling Time: 6祍; Single Supply: No; DatasheetVersion: Rev.B; PackageVersion: 100808-A; PackageReference: Q-24-1; PackageDescription: 24-Lead Ceramic Dual In-Line Package [CERDIP]; Supplier Part Number 1: 584-AD660SQ883B; Packing: Tube; RoHS: N; Mounting Technology: Through Hole; ComponentLink1Description: Manufacturer URL; ComponentLink2Description: Datasheet; ComponentLink3Description: Package Specification; ComponentLink4Description: Product URL
footprint DIP24 (Footprint not found)
pins: 1 -VEE (power) "Negative Analog Supply Pin", 2 +VCC (power) "Positive Analog Supply Pin", 3 +VLL (power) "Digital Supply Pin", 4 DGND (power) "Digital Ground Reference Pin", 5 DB7/DB15 (in) "DB7 and DB15 Byte Load Data Input Pin", 6 DB6/DB14 (in) "DB6 and DB14 Byte Load Data Input Pin", 7 DB5/DB13 (in) "DB5 and DB13 Byte Load Data Input Pin", 8 DB4/DB12 (in) "DB4 and DB12 Byte Load Data Input Pin", 9 DB3/DB11 (in) "DB3 and DB11 Byte Load Data Input Pin", 10 DB2/DB10 (in) "DB2 and DB10 Byte Load Data Input Pin", 11 DB1/DB9/DATADIR (in) "DB1 and DB9 Byte Load Data Input Pin/MSB or L\S\B\ First Data Direction Serial Input Select Pin", 12 DB0/DB8/SIN (in) "DB0 and DB8 Byte Load Data Input Pin/Serial Data Input Pin", 13 SOUT (out) "Serial Data Output Pin", 14 ~{CS} (in) "Chip Select Pin", 15 ~{LBE}/CLEAR SELECT (in) "Low Byte Enable Pin/U\n\i\p\o\l\ar or Bipolar Clear Select Pin", 16 ~{HBE} (in) "High Byte Enable Pin", 17 ~{SER} (in) "Serial Input Enable Pin", 18 ~{CLR} (in) "Output Clear Pin", 19 LDAC (in) "Load DAC Pin", 20 AGND (power) "Analog Ground Reference Pin", 21 VOUT (out) "Voltage Output Pin", 22 SPAN/BIPOLAR OFFSET (in) "Output Span Configuration Pin", 23 REF IN (in) "External Reference Voltage Input Pin", 24 REF OUT (out) "Internal Reference Voltage Output Pin"

## AD664AD-BIP
designator U?
Quad 12-Bit Monolithic Digital-to-Analog Converter, -40 to +85 degC, D-28-2, Tube; Generic Part Number: AD664; PartNumber: AD664AD-BIP; # DAC Outputs: 4; Max V+: 16.5V; Op Pwr Diss: 525mW; Resolution (Bits): 12; Settling Time: 8祍; Single Supply: No; DatasheetVersion: Rev.D; PackageVersion: Oct-2004; PackageReference: D-28-2; PackageDescription: 28-Lead Side-Brazed Ceramic Dual In-Line Package [SBDIP]; Supplier Part Number 1: AD664AD-BIP-ND; Supplier Part Number 2: 584-AD664AD-BIP; Packing: Tube; RoHS: N; Mounting Technology: Through Hole; ComponentLink1Description: Manufacturer URL; ComponentLink2Description: Datasheet; ComponentLink3Description: Package Specification; ComponentLink4Description: Product URL
footprint DIP28W (Footprint not found)
pins: 1 VREFIN (in), 2 VOC (hiz), 3 VOD (hiz), 4 ~{CS} (in), 5 DS0 (in), 6 DS1 (in), 7 DGND (power), 8 ~{RST} (in), 9 DB0 (LSB) (io), 10 DB1 (io), 11 DB2 (io), 12 DB3 (io), 13 DB4 (io), 14 DB5 (io), 15 DB6 (io), 16 DB7 (io), 17 DB8 (io), 18 DB9 (io), 19 DB10 (io), 20 DB11 (MSB) (io), 21 VLL (+5V) (power), 22 ~{RD} (in), 23 ~{LS} (in), 24 AGND (power), 25 VCC (+12V/+15V) (power), 26 VEE(-12V/-15V) (power), 27 VOA (hiz), 28 VOB (hiz)

## AD664AD-UNI
designator U?
Quad 12-Bit Monolithic Digital-to-Analog Converter, -40 to +85 degC, D-28-2, Tube; Generic Part Number: AD664; PartNumber: AD664AD-UNI; # DAC Outputs: 4; Max V+: 16.5V; Op Pwr Diss: 525mW; Resolution (Bits): 12; Settling Time: 8祍; Single Supply: No; DatasheetVersion: Rev.D; PackageVersion: Oct-2004; PackageReference: D-28-2; PackageDescription: 28-Lead Side-Brazed Ceramic Dual In-Line Package [SBDIP]; Supplier Part Number 1: AD664AD-UNI-ND; Supplier Part Number 2: 584-AD664AD-UNI; Packing: Tube; RoHS: N; Mounting Technology: Through Hole; ComponentLink1Description: Manufacturer URL; ComponentLink2Description: Datasheet; ComponentLink3Description: Package Specification; ComponentLink4Description: Product URL
footprint DIP28W (Footprint not found)
pins: 1 VREFIN (in), 2 VOC (hiz), 3 VOD (hiz), 4 ~{CS} (in), 5 DS0 (in), 6 DS1 (in), 7 DGND (power), 8 ~{RST} (in), 9 DB0 (LSB) (io), 10 DB1 (io), 11 DB2 (io), 12 DB3 (io), 13 DB4 (io), 14 DB5 (io), 15 DB6 (io), 16 DB7 (io), 17 DB8 (io), 18 DB9 (io), 19 DB10 (io), 20 DB11 (MSB) (io), 21 VLL (+5V) (power), 22 ~{RD} (in), 23 ~{LS} (in), 24 AGND (power), 25 VCC (+12V/+15V) (power), 26 VEE(-12V/-15V) (power), 27 VOA (hiz), 28 VOB (hiz)
